# Altium footprint library Wurth_Elektronik_Electromechanic_Wire_to_Board_Connectors_rev16a.PCBLIB: 662 footprints (part 35 of 42)
Each footprint in its own frame and in the unit in brackets; x right, y up, seen from the top. Pads: shape width x height; smd on the part's side, far side on the other; paste and mask are expansions set on the pad; w line width, h text height; cw(c..) or ccw(c..) is an arc to the next point about the centre after c.
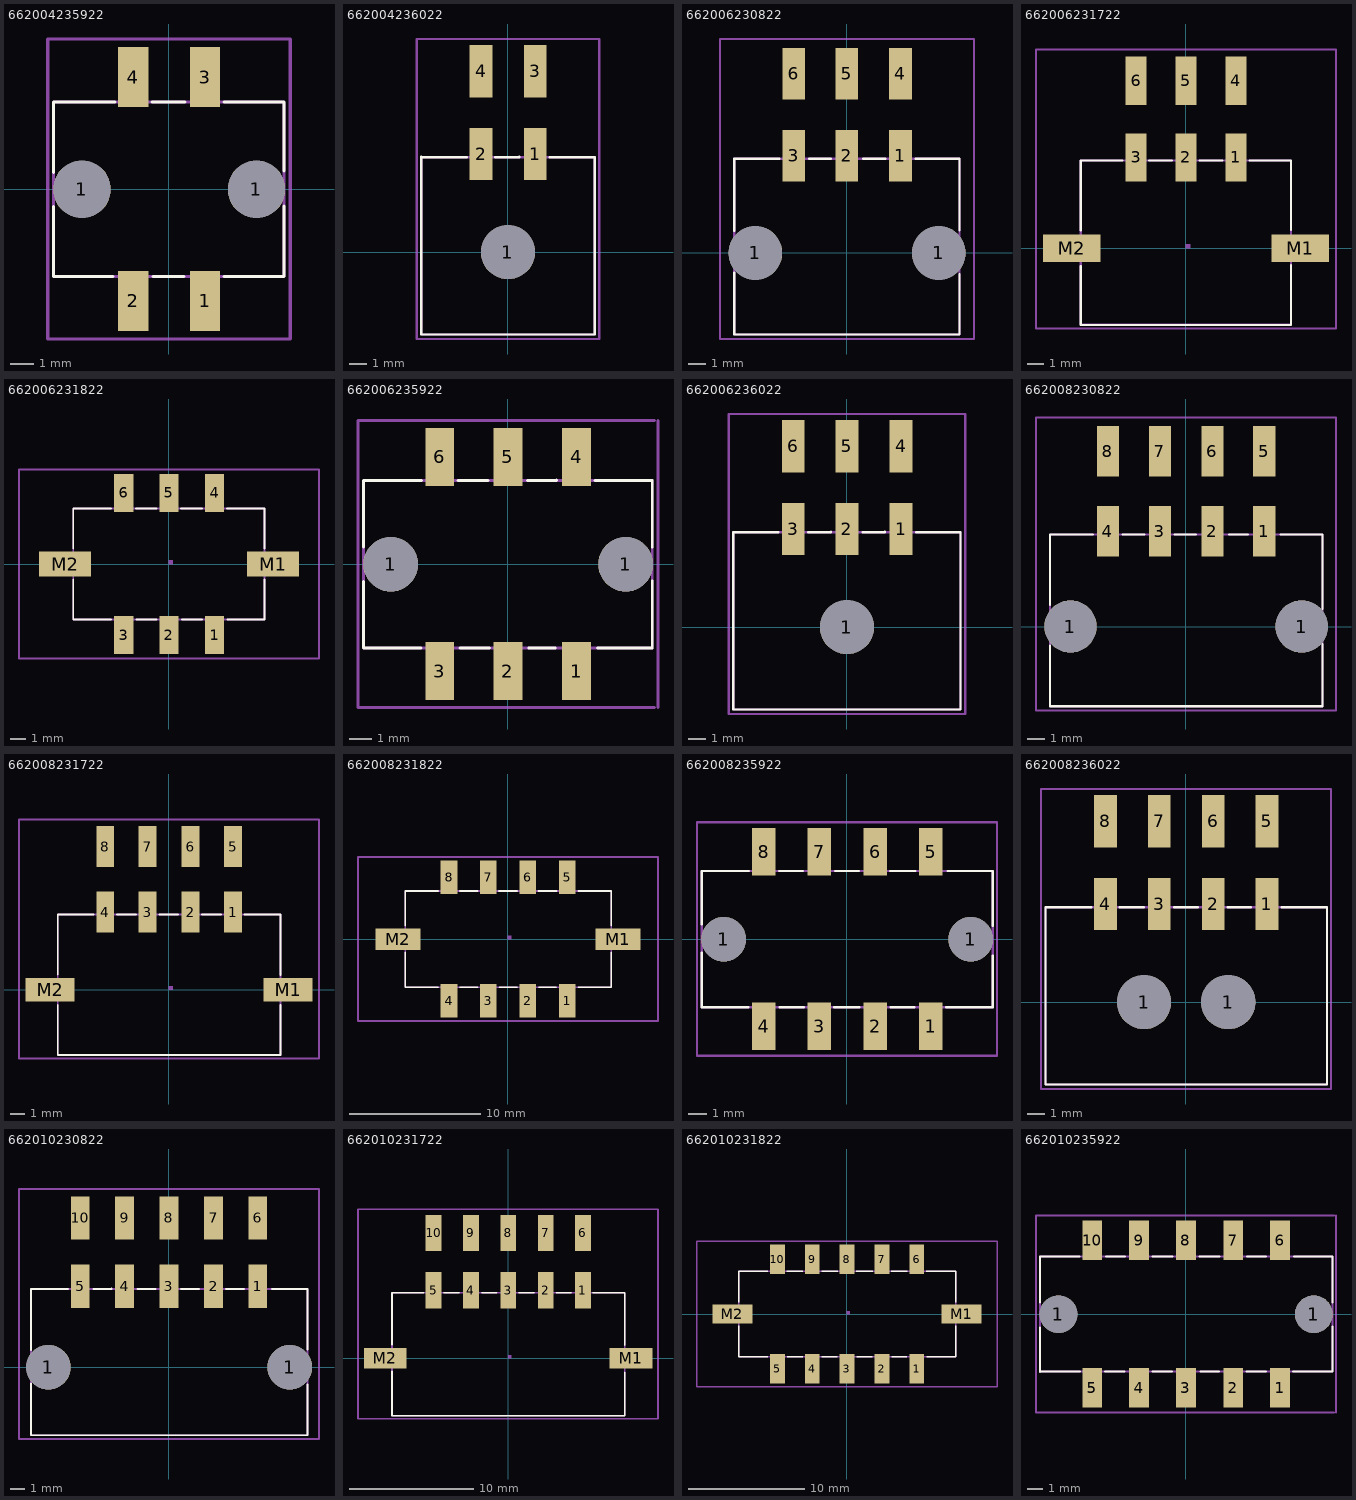
[diagram p34: the footprints below, top view; thin cyan lines are the x and y axes]

## 662004235922 [mil]
pads (6):
  round 95 hole 95: 1(-144.09,0) 1(145,0)
  rect 50x100 smd: 1(60,-185.04) 2(-59.06,-185.04) 3(60,186) 4(-59.06,186)
Top Overlay:
  lines w5: -190.94,-28.35 -190.94,-144.88 -92.52,-144.88 ; -190.94,28 -190.94,145 -88.98,145 ; -28.35,145 27,145 ; -26.77,-144.88 25,-144.88 ; 91,-144.88 191,-144.88 191,-27.56 ; 91,145 191,145 191,30
Mechanical 2:
  text ">NAME" at 241,50 h77.5
Mechanical 4:
  text ">VALUE" at 241,-84.06 h77.5
Mechanical 16:
  lines w5: -190.94,-144.88 191,-144.88 191,145 -190.94,145 -190.94,-144.88
  text "1" at 35,-200 h77.5
  text "4" at -84.06,155 h77.5
Mechanical 27:
  lines w5: -200.79,-248.03 201,-248.03 201,249 -200.79,249 -200.79,-248.03

## 662004236022 [mil]
pads (5):
  round 119 hole 119: 1(0,0)
  rect 50x115 smd: 1(60,216) 2(-59.06,216) 3(60,398) 4(-59.06,398)
Top Overlay:
  lines w5: -190.94,209 -190.94,-181.1 191,-181.1 191,209 ; -190.55,210 -190.55,209 -90.55,209 ; -27.95,209 25,209 25,210 ; 92,209 191,209 ; 191,209 191,209
Mechanical 2:
  text ">NAME" at 285,141 h77.5
Mechanical 4:
  text ">VALUE" at 285,66 h77.5
Mechanical 16:
  lines w5: -190.94,-181.1 191,-181.1 191,209 -190.94,209 -190.94,-181.1
  text "1" at 35,157 h77.5
  text "4" at -65.94,382 h77.5
Mechanical 27:
  lines w5: -200.79,-190.94 201,-190.94 201,469 -200.79,469 -200.79,-190.94

## 662006230822 [mil]
pads (8):
  round 119 hole 119: 1(-203.15,0) 1(204,0)
  rect 50x115 smd: 1(119,216) 2(0,216) 3(-118.11,216) 4(119,398) 5(0,398) 6(-118.11,398)
Top Overlay:
  lines w5: -250,-43.31 -250,-181.1 250,-181.1 250,-46.85 ; -250,49 -250,209 -150,209 ; -83.46,209 -35.04,209 ; 36,209 85,209 85,210 ; 153,209 250,209 250,50
Mechanical 2:
  text ">NAME" at 344,82 h77.5
Mechanical 4:
  text ">VALUE" at 344,7 h77.5
Mechanical 16:
  lines w5: -250,-181.1 250,-181.1 250,209 -250,209 -250,-181.1
  text "1" at 94,157 h77.5
  text "6" at -131.89,332 h77.5
Mechanical 27:
  lines w5: -281.5,-190.94 282,-190.94 282,475 -281.5,475 -281.5,-190.94

## 662006231722 [mil]
pads (8):
  rect 50x115 smd: 1(119,216) 2(0,216) 3(-118.11,216) 4(119,398) 5(0,398) 6(-118.11,398)
  rect 136x65 smd: M1(272,0) M2(-271.46,0)
Top Overlay:
  lines w5: -250,-41.73 -250,-181.89 250,-181.89 250,-40.16 ; -250,43 -250,209 -150.39,209 ; -87.8,209 -32.68,209 ; 32,209 87,209 ; 152,209 250,209 250,44
Mechanical 2:
  text ">NAME" at 414,71 h77.5
Mechanical 4:
  text ">VALUE" at 419,-18.31 h77.5
Mechanical 10:
  region: 0,0 10,0 10,10 0,10
Mechanical 16:
  lines w5: -250,-181.1 250,-181.1 250,209 -250,209 -250,-181.1
  text "1" at 94,157 h77.5
  text "6" at -125,332 h77.5
Mechanical 27:
  lines w5: -356.3,-190.94 357,-190.94 357,473 -356.3,473 -356.3,-190.94

## 662006231822 [mil]
pads (8):
  rect 50x100 smd: 1(119,-185.04) 2(0,-185.04) 3(-118.11,-185.04) 4(119,186) 5(0,186) 6(-118.11,186)
  rect 136x65 smd: M1(272,0) M2(-271.46,0)
Top Overlay:
  lines w5: -250,-39.76 -250,-144.88 -150.79,-144.88 ; -250,41 -250,145 -150.79,145 ; -86.22,145 -31.89,145 ; -85.04,-144.88 -32.68,-144.88 ; 32,145 87,145 ; 34,-144.88 86,-144.88 ; 152,145 250,145 250,41 ; 153,-144.88 250,-144.88 250,-39.76
Mechanical 2:
  text ">NAME" at 449,38 h77.5
Mechanical 4:
  text ">VALUE" at 446,-24.41 h77.5
Mechanical 10:
  region: 0,0 10,0 10,10 0,10
  region: 0,0 10,0 10,10 0,10
  region: 0,0 10,0 10,10 0,10
  region: 0,0 10,0 10,10 0,10
  region: 0,0 10,0 10,10 0,10
Mechanical 16:
  lines w5: -250,-144.88 250,-144.88 250,145 -250,145 -250,-144.88
  text "1" at 105,-216.14 h77.5
  text "6" at -140.35,167 h77.5
Mechanical 27:
  lines w5: -391.73,-246.06 -391.73,247 392,247 392,-246.06 -391.73,-246.06

## 662006235922 [mil]
pads (8):
  round 95 hole 95: 1(-203.15,0) 1(204,0)
  rect 50x100 smd: 1(119,-185.04) 2(0,-185.04) 3(-118.11,-185.04) 4(119,186) 5(0,186) 6(-118.11,186)
Top Overlay:
  lines w5: -250,-144.88 -250,-29.53 ; -250,30 -250,145 -150,145 ; -249.61,-143.31 -249.61,-144.88 -150.39,-144.88 ; -86.61,145 -34.65,145 ; -83.07,-144.88 -32.28,-144.88 ; 34,145 84,145 84,146 ; 36,-144.88 82,-144.88 ; 151,145 250,145 250,30 ; 155,-144.88 250,-144.88 ; 250,-143.7 250,-144.88 ; 250,-144.88 250,-28.74 ; 250,-28.74 250,-28.74
Mechanical 2:
  text ">NAME" at 300,50 h77.5
Mechanical 4:
  text ">VALUE" at 300,-25 h77.5
Mechanical 16:
  lines w5: -250,-144.88 250,-144.88 250,145 -250,145 -250,-144.88
  text "1" at 94,-200 h77.5
  text "6" at -175,155 h77.5
Mechanical 27:
  lines w5: 254,-248.03 -259.84,-248.03 -259.84,249 254,249 ; 260,-248.03 260,249

## 662006236022 [mil]
pads (7):
  round 119 hole 119: 1(0,0)
  rect 50x115 smd: 1(119,216) 2(0,216) 3(-118.11,216) 4(119,398) 5(0,398) 6(-118.11,398)
Top Overlay:
  lines w5: -150.79,209 -250,209 -250,-181.1 250,-181.1 250,209 ; -85.83,209 -35.04,209 -35.04,210 ; 35,209 83,209 83,210 ; 152,209 250,209 ; 250,208 250,209
Mechanical 2:
  text ">NAME" at 344,82 h77.5
Mechanical 4:
  text ">VALUE" at 344,7 h77.5
Mechanical 16:
  lines w5: -250,-181.1 250,-181.1 250,209 -250,209 -250,-181.1
  text "1" at 94,157 h77.5
  text "6" at -131.89,332 h77.5
Mechanical 27:
  lines w5: -259.84,-190.94 260,-190.94 260,469 -259.84,469 -259.84,-190.94

## 662008230822 [mil]
pads (10):
  round 119 hole 119: 1(-262.2,0) 1(263,0)
  rect 50x115 smd: 1(178,216) 2(60,216) 3(-59.06,216) 4(-177.17,216) 5(178,398) 6(60,398) 7(-59.06,398) 8(-177.17,398)
Top Overlay:
  lines w5: -309.06,-43.31 -309.06,-181.1 310,-181.1 310,-39.76 ; -309.06,49 -309.06,209 -211.42,209 ; -144.09,209 -94.49,209 ; -25.59,209 23,209 ; 98,209 141,209 ; 215,209 310,209 310,40
Mechanical 2:
  text ">NAME" at 403,82 h77.5
Mechanical 4:
  text ">VALUE" at 403,7 h77.5
Mechanical 16:
  lines w5: -309.06,-181.1 310,-181.1 310,209 -309.06,209 -309.06,-181.1
  text "1" at 153,157 h77.5
  text "8" at -197.83,332 h77.5
Mechanical 27:
  lines w5: -340.55,-190.94 341,-190.94 341,475 -340.55,475 -340.55,-190.94

## 662008231722 [mil]
pads (10):
  rect 50x115 smd: 1(178,216) 2(60,216) 3(-59.06,216) 4(-177.17,216) 5(178,398) 6(60,398) 7(-59.06,398) 8(-177.17,398)
  rect 136x65 smd: M1(331,0) M2(-330.51,0)
Top Overlay:
  lines w5: -309.06,-42.52 -309.06,-181.1 310,-181.1 310,-41.73 ; -309.06,42 -309.06,209 -209.06,209 ; -144.88,209 -90.94,209 ; -26.77,209 26,209 ; 91,209 145,209 ; 209,209 310,209 310,40
Mechanical 2:
  text ">NAME" at 473,71 h77.5
Mechanical 4:
  text ">VALUE" at 478,-18.31 h77.5
Mechanical 10:
  region: 0,0 10,0 10,10 0,10
Mechanical 16:
  lines w5: -309.06,-181.1 310,-181.1 310,209 -309.06,209 -309.06,-181.1
  text "1" at 153,157 h77.5
  text "8" at -190.94,332 h77.5
Mechanical 27:
  lines w5: -416.93,-190.94 417,-190.94 417,473 -416.93,473 -416.93,-190.94

## 662008231822 [mil]
pads (10):
  rect 50x100 smd: 1(178,-185.04) 2(60,-185.04) 3(-59.06,-185.04) 4(-177.17,-185.04) 5(178,186) 6(60,186) 7(-59.06,186) 8(-177.17,186)
  rect 136x65 smd: M1(331,0) M2(-330.51,0)
Top Overlay:
  lines w5: -309.06,-39.76 -309.06,-144.88 -209.84,-144.88 ; -309.06,41 -309.06,145 -209.84,145 ; -145.28,145 -90.94,145 ; -144.09,-144.88 -91.73,-144.88 ; -27.17,145 28,145 ; -25.98,-144.88 27,-144.88 ; 91,145 146,145 ; 93,-144.88 145,-144.88 ; 211,145 310,145 310,41 ; 212,-144.88 310,-144.88 310,-39.76
Mechanical 2:
  text ">NAME" at 508,38 h77.5
Mechanical 4:
  text ">VALUE" at 505,-24.41 h77.5
Mechanical 10:
  region: 0,0 10,0 10,10 0,10
  region: 0,0 10,0 10,10 0,10
  region: 0,0 10,0 10,10 0,10
  region: 0,0 10,0 10,10 0,10
  region: 0,0 10,0 10,10 0,10
  region: 0,0 10,0 10,10 0,10
  region: 0,0 10,0 10,10 0,10
Mechanical 16:
  lines w5: -309.06,-144.88 310,-144.88 310,145 -309.06,145 -309.06,-144.88
  text "1" at 164,-216.14 h77.5
  text "8" at -206.3,167 h77.5
Mechanical 27:
  lines w5: -450.79,-246.06 -450.79,247 451,247 451,-246.06 -450.79,-246.06

## 662008235922 [mil]
pads (10):
  round 95 hole 95: 1(-262.2,0) 1(263,0)
  rect 50x100 smd: 1(178,-185.04) 2(60,-185.04) 3(-59.06,-185.04) 4(-177.17,-185.04) 5(178,186) 6(60,186) 7(-59.06,186) 8(-177.17,186)
Top Overlay:
  lines w5: -309.06,-28.35 -309.06,-144.88 -209.84,-144.88 ; -308.66,32 -308.66,145 -208.66,145 ; -144.49,145 -93.7,145 ; -143.31,-144.88 -91.34,-144.88 ; -26.77,-144.88 26,-144.88 26,-144.09 ; -25.2,145 25,145 ; 92,145 145,145 ; 93,-144.88 143,-144.88 ; 211,-144.88 310,-144.88 310,-143.7 310,-34.65 ; 214,145 310,145 310,28 ; -93.7,145 -93.7,145
Mechanical 2:
  text ">NAME" at 360,90 h77.5
Mechanical 4:
  text ">VALUE" at 360,15 h77.5
Mechanical 16:
  lines w5: -309.06,-144.88 310,-144.88 310,145 -309.06,145 -309.06,-144.88
  text "1" at 153,-200 h77.5
  text "8" at -184.06,155 h77.5
Mechanical 27:
  lines w5: -318.9,-248.03 319,-248.03 319,249 -318.9,249 -318.9,-248.03

## 662008236022 [mil]
pads (10):
  round 119 hole 119: 1(-92.13,0) 1(93,0)
  rect 50x115 smd: 1(178,216) 2(60,216) 3(-59.06,216) 4(-177.17,216) 5(178,398) 6(60,398) 7(-59.06,398) 8(-177.17,398)
Top Overlay:
  lines w5: -208.66,209 -309.06,209 -309.06,-181.1 310,-181.1 310,209 ; -146.46,209 -92.52,209 ; -26.38,209 26,209 ; 92,209 143,209 ; 210,209 309,209
Mechanical 2:
  text ">NAME" at 403,82 h77.5
Mechanical 4:
  text ">VALUE" at 403,7 h77.5
Mechanical 16:
  lines w5: -309.06,-181.1 310,-181.1 310,209 -309.06,209 -309.06,-181.1
  text "1" at 153,157 h77.5
  text "8" at -197.83,332 h77.5
Mechanical 27:
  lines w5: -318.9,-190.94 319,-190.94 319,469 -318.9,469 -318.9,-190.94

## 662010230822 [mil]
pads (12):
  round 119 hole 119: 1(-321.26,0) 1(322,0)
  rect 50x115 smd: 1(237,216) 2(119,216) 3(0,216) 4(-118.11,216) 5(-236.22,216) 6(237,398) 7(119,398) 8(0,398) 9(-118.11,398) 10(-236.22,398)
Top Overlay:
  lines w5: -368.11,-43.31 -368.11,-181.1 369,-181.1 369,-45.67 ; -368.11,46 -368.11,209 -269.29,209 ; -201.57,209 -153.54,209 -153.54,210 ; -83.86,209 -35.83,209 ; 32,209 80,209 ; 152,209 200,209 ; 275,209 369,209 369,47
Mechanical 2:
  text ">NAME" at 462,82 h77.5
Mechanical 4:
  text ">VALUE" at 462,7 h77.5
Mechanical 16:
  lines w5: -368.11,-181.1 369,-181.1 369,209 -368.11,209 -368.11,-181.1
  text "1" at 212,157 h77.5
  text "10" at -263.78,332 h77.5
Mechanical 27:
  lines w5: -399.61,-190.94 400,-190.94 400,475 -399.61,475 -399.61,-190.94

## 662010231722 [mil]
pads (12):
  rect 50x115 smd: 1(237,216) 2(119,216) 3(0,216) 4(-118.11,216) 5(-236.22,216) 6(237,398) 7(119,398) 8(0,398) 9(-118.11,398) 10(-236.22,398)
  rect 136x65 smd: M1(390,0) M2(-389.57,0)
Top Overlay:
  lines w5: -368.11,-40.94 -368.11,-181.1 369,-181.1 369,-43.31 ; -368.11,43 -368.11,209 -268.11,209 ; -204.33,209 -154.72,209 ; -83.46,209 -35.83,209 ; 33,209 83,209 ; 152,209 200,209 ; 269,209 369,209 369,42
Mechanical 2:
  text ">NAME" at 532,71 h77.5
Mechanical 4:
  text ">VALUE" at 537,-18.31 h77.5
Mechanical 10:
  region: 0,0 10,0 10,10 0,10
Mechanical 16:
  lines w5: -368.11,-181.1 369,-181.1 369,209 -368.11,209 -368.11,-181.1
  text "1" at 212,157 h77.5
  text "10" at -256.89,332 h77.5
Mechanical 27:
  lines w5: -475.98,-190.94 -475.98,473 ; -474.41,-190.94 475,-190.94 475,473 -474.41,473

## 662010231822 [mil]
pads (12):
  rect 50x100 smd: 1(237,-185.04) 2(119,-185.04) 3(0,-185.04) 4(-118.11,-185.04) 5(-236.22,-185.04) 6(237,186) 7(119,186) 8(0,186) 9(-118.11,186) 10(-236.22,186)
  rect 136x65 smd: M1(390,0) M2(-389.57,0)
Top Overlay:
  lines w5: -368.11,-39.76 -368.11,-144.88 -268.9,-144.88 ; -368.11,41 -368.11,145 -268.9,145 ; -204.33,145 -150,145 ; -203.15,-144.88 -150.79,-144.88 ; -86.22,145 -31.89,145 ; -85.04,-144.88 -32.68,-144.88 ; 32,145 87,145 ; 34,-144.88 86,-144.88 ; 150,145 205,145 ; 152,-144.88 204,-144.88 ; 270,145 369,145 369,41 ; 271,-144.88 369,-144.88 369,-39.76
Mechanical 2:
  text ">NAME" at 567,38 h77.5
Mechanical 4:
  text ">VALUE" at 564,-24.41 h77.5
Mechanical 10:
  region: 0,0 10,0 10,10 0,10
  region: 0,0 10,0 10,10 0,10
  region: 0,0 10,0 10,10 0,10
  region: 0,0 10,0 10,10 0,10
  region: 0,0 10,0 10,10 0,10
  region: 0,0 10,0 10,10 0,10
  region: 0,0 10,0 10,10 0,10
  region: 0,0 10,0 10,10 0,10
  region: 0,0 10,0 10,10 0,10
Mechanical 16:
  lines w5: -368.11,-144.88 369,-144.88 369,145 -368.11,145 -368.11,-144.88
  text "1" at 223,-216.14 h77.5
  text "10" at -272.24,167 h77.5
Mechanical 27:
  lines w5: -509.84,-246.06 -509.84,247 510,247 510,-246.06 -509.84,-246.06

## 662010235922 [mil]
pads (12):
  round 95 hole 95: 1(-321.26,0) 1(322,0)
  rect 50x100 smd: 1(237,-185.04) 2(119,-185.04) 3(0,-185.04) 4(-118.11,-185.04) 5(-236.22,-185.04) 6(237,186) 7(119,186) 8(0,186) 9(-118.11,186) 10(-236.22,186)
Top Overlay:
  lines w5: -368.11,-145.28 -368.11,-33.07 ; -368.11,30 -368.11,145 -267.72,145 ; -367.32,-142.91 -367.32,-144.88 -267.32,-144.88 ; -203.54,-144.88 -154.33,-144.88 ; -201.97,145 -153.15,145 ; -85.04,145 -34.25,145 ; -84.25,-144.88 -34.65,-144.88 ; 34,145 84,145 ; 36,-144.88 83,-144.88 ; 152,-144.88 202,-144.88 ; 154,145 202,145 ; 270,-144.88 369,-144.88 369,-30.71 ; 272,145 369,145 369,29
Mechanical 2:
  text ">NAME" at 419,90 h77.5
Mechanical 4:
  text ">VALUE" at 419,15 h77.5
Mechanical 16:
  lines w5: -368.11,-144.88 369,-144.88 369,145 -368.11,145 -368.11,-144.88
  text "1" at 212,-200 h77.5
  text "10" at -275,155 h77.5
Mechanical 27:
  lines w5: 373,-248.03 -377.95,-248.03 -377.95,249 373,249 ; 378,-248.03 378,249